# Altium footprint library Connector_PinHeader_2.54mm.PcbLib: 278 footprints (part 18 of 18)
Each footprint in its own frame and in the unit in brackets; x right, y up, seen from the top. Pads: shape width x height; smd on the part's side, far side on the other; paste and mask are expansions set on the pad; w line width, h text height; cw(c..) or ccw(c..) is an arc to the next point about the centre after c.
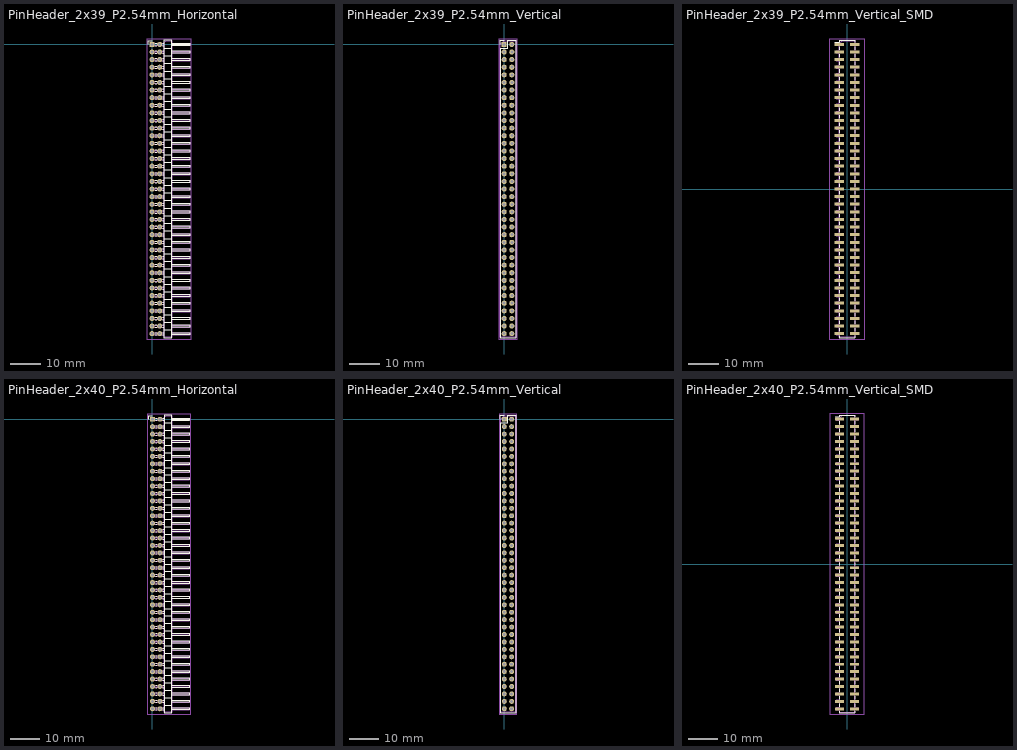
[diagram p17: the footprints below, top view; thin cyan lines are the x and y axes]

## PinHeader_2x39_P2.54mm_Horizontal [mm]
pads (78):
  rect 1.7x1.7 hole 1: 1(0,0)
  rrect100% 1.7x1.7 hole 1: 2(2.54,0) 3(0,-2.54) 4(2.54,-2.54) 5(0,-5.08) 6(2.54,-5.08) 7(0,-7.62) 8(2.54,-7.62) 9(0,-10.16) 10(2.54,-10.16) 11(0,-12.7) 12(2.54,-12.7) 13(0,-15.24) 14(2.54,-15.24) 15(0,-17.78) 16(2.54,-17.78) 17(0,-20.32) 18(2.54,-20.32) 19(0,-22.86) 20(2.54,-22.86) 21(0,-25.4) 22(2.54,-25.4) 23(0,-27.94) 24(2.54,-27.94) 25(0,-30.48) 26(2.54,-30.48) 27(0,-33.02) 28(2.54,-33.02) 29(0,-35.56) 30(2.54,-35.56) 31(0,-38.1) 32(2.54,-38.1) 33(0,-40.64) 34(2.54,-40.64) 35(0,-43.18) 36(2.54,-43.18) 37(0,-45.72) 38(2.54,-45.72) 39(0,-48.26) 40(2.54,-48.26) 41(0,-50.8) 42(2.54,-50.8) 43(0,-53.34) 44(2.54,-53.34) 45(0,-55.88) 46(2.54,-55.88) 47(0,-58.42) 48(2.54,-58.42) 49(0,-60.96) 50(2.54,-60.96) 51(0,-63.5) 52(2.54,-63.5) 53(0,-66.04) 54(2.54,-66.04) 55(0,-68.58) 56(2.54,-68.58) 57(0,-71.12) 58(2.54,-71.12) 59(0,-73.66) 60(2.54,-73.66) 61(0,-76.2) 62(2.54,-76.2) 63(0,-78.74) 64(2.54,-78.74) 65(0,-81.28) 66(2.54,-81.28) 67(0,-83.82) 68(2.54,-83.82) 69(0,-86.36) 70(2.54,-86.36) 71(0,-88.9) 72(2.54,-88.9) 73(0,-91.44) 74(2.54,-91.44) 75(0,-93.98) 76(2.54,-93.98) 77(0,-96.52) 78(2.54,-96.52)
F.SilkS:
  drawing of 323 lines, arcs and shapes, not listed
F.CrtYd:
  lines w0.254: -1.8,-98.3 -1.8,1.8 13.1,1.8 13.1,-98.3 -1.8,-98.3
F.Fab:
  drawing of 239 lines, arcs and shapes, not listed
  text "'.Designator'" at 6.15,-52.307 h1

## PinHeader_2x39_P2.54mm_Vertical [mm]
pads (78):
  rect 1.7x1.7 hole 1: 1(0,0)
  rrect100% 1.7x1.7 hole 1: 2(2.54,0) 3(0,-2.54) 4(2.54,-2.54) 5(0,-5.08) 6(2.54,-5.08) 7(0,-7.62) 8(2.54,-7.62) 9(0,-10.16) 10(2.54,-10.16) 11(0,-12.7) 12(2.54,-12.7) 13(0,-15.24) 14(2.54,-15.24) 15(0,-17.78) 16(2.54,-17.78) 17(0,-20.32) 18(2.54,-20.32) 19(0,-22.86) 20(2.54,-22.86) 21(0,-25.4) 22(2.54,-25.4) 23(0,-27.94) 24(2.54,-27.94) 25(0,-30.48) 26(2.54,-30.48) 27(0,-33.02) 28(2.54,-33.02) 29(0,-35.56) 30(2.54,-35.56) 31(0,-38.1) 32(2.54,-38.1) 33(0,-40.64) 34(2.54,-40.64) 35(0,-43.18) 36(2.54,-43.18) 37(0,-45.72) 38(2.54,-45.72) 39(0,-48.26) 40(2.54,-48.26) 41(0,-50.8) 42(2.54,-50.8) 43(0,-53.34) 44(2.54,-53.34) 45(0,-55.88) 46(2.54,-55.88) 47(0,-58.42) 48(2.54,-58.42) 49(0,-60.96) 50(2.54,-60.96) 51(0,-63.5) 52(2.54,-63.5) 53(0,-66.04) 54(2.54,-66.04) 55(0,-68.58) 56(2.54,-68.58) 57(0,-71.12) 58(2.54,-71.12) 59(0,-73.66) 60(2.54,-73.66) 61(0,-76.2) 62(2.54,-76.2) 63(0,-78.74) 64(2.54,-78.74) 65(0,-81.28) 66(2.54,-81.28) 67(0,-83.82) 68(2.54,-83.82) 69(0,-86.36) 70(2.54,-86.36) 71(0,-88.9) 72(2.54,-88.9) 73(0,-91.44) 74(2.54,-91.44) 75(0,-93.98) 76(2.54,-93.98) 77(0,-96.52) 78(2.54,-96.52)
F.SilkS:
  lines w0.254: -1.33,0 -1.33,1.33 0,1.33 ; -1.33,-97.85 -1.33,-1.27 1.27,-1.27 1.27,1.33 3.87,1.33 3.87,-97.85 -1.33,-97.85
F.CrtYd:
  lines w0.254: -1.8,-98.3 -1.8,1.8 4.35,1.8 4.35,-98.3 -1.8,-98.3
F.Fab:
  lines w0.254: -1.27,-97.79 -1.27,0 0,1.27 3.81,1.27 3.81,-97.79 -1.27,-97.79
  text "'.Designator'" at 2.11,-52.307 h1

## PinHeader_2x39_P2.54mm_Vertical_SMD [mm]
pads (78):
  rect 3.15x1 smd: 1(-2.525,48.26) 2(2.525,48.26) 3(-2.525,45.72) 4(2.525,45.72) 5(-2.525,43.18) 6(2.525,43.18) 7(-2.525,40.64) 8(2.525,40.64) 9(-2.525,38.1) 10(2.525,38.1) 11(-2.525,35.56) 12(2.525,35.56) 13(-2.525,33.02) 14(2.525,33.02) 15(-2.525,30.48) 16(2.525,30.48) 17(-2.525,27.94) 18(2.525,27.94) 19(-2.525,25.4) 20(2.525,25.4) 21(-2.525,22.86) 22(2.525,22.86) 23(-2.525,20.32) 24(2.525,20.32) 25(-2.525,17.78) 26(2.525,17.78) 27(-2.525,15.24) 28(2.525,15.24) 29(-2.525,12.7) 30(2.525,12.7) 31(-2.525,10.16) 32(2.525,10.16) 33(-2.525,7.62) 34(2.525,7.62) 35(-2.525,5.08) 36(2.525,5.08) 37(-2.525,2.54) 38(2.525,2.54) 39(-2.525,0) 40(2.525,0) 41(-2.525,-2.54) 42(2.525,-2.54) 43(-2.525,-5.08) 44(2.525,-5.08) 45(-2.525,-7.62) 46(2.525,-7.62) 47(-2.525,-10.16) 48(2.525,-10.16) 49(-2.525,-12.7) 50(2.525,-12.7) 51(-2.525,-15.24) 52(2.525,-15.24) 53(-2.525,-17.78) 54(2.525,-17.78) 55(-2.525,-20.32) 56(2.525,-20.32) 57(-2.525,-22.86) 58(2.525,-22.86) 59(-2.525,-25.4) 60(2.525,-25.4) 61(-2.525,-27.94) 62(2.525,-27.94) 63(-2.525,-30.48) 64(2.525,-30.48) 65(-2.525,-33.02) 66(2.525,-33.02) 67(-2.525,-35.56) 68(2.525,-35.56) 69(-2.525,-38.1) 70(2.525,-38.1) 71(-2.525,-40.64) 72(2.525,-40.64) 73(-2.525,-43.18) 74(2.525,-43.18) 75(-2.525,-45.72) 76(2.525,-45.72) 77(-2.525,-48.26) 78(2.525,-48.26)
F.SilkS:
  lines w0.254: -4.04,49.02 -2.6,49.02 -2.6,49.59 2.6,49.59 2.6,49.02 ; -2.6,-49.02 -2.6,-49.59 2.6,-49.59 2.6,-49.02 ; -2.6,-47.5 -2.6,-46.48 ; -2.6,-44.96 -2.6,-43.94 ; -2.6,-42.42 -2.6,-41.4 ; -2.6,-39.88 -2.6,-38.86 ; -2.6,-37.34 -2.6,-36.32 ; -2.6,-34.8 -2.6,-33.78 ; -2.6,-32.26 -2.6,-31.24 ; -2.6,-29.72 -2.6,-28.7 ; -2.6,-27.18 -2.6,-26.16 ; -2.6,-24.64 -2.6,-23.62 ; -2.6,-22.1 -2.6,-21.08 ; -2.6,-19.56 -2.6,-18.54 ; -2.6,-17.02 -2.6,-16 ; -2.6,-14.48 -2.6,-13.46 ; -2.6,-11.94 -2.6,-10.92 ; -2.6,-9.4 -2.6,-8.38 ; -2.6,-6.86 -2.6,-5.84 ; -2.6,-4.32 -2.6,-3.3 ; -2.6,-1.78 -2.6,-0.76 ; -2.6,0.76 -2.6,1.78 ; -2.6,3.3 -2.6,4.32 ; -2.6,5.84 -2.6,6.86 ; -2.6,8.38 -2.6,9.4 ; -2.6,10.92 -2.6,11.94 ; -2.6,13.46 -2.6,14.48 ; -2.6,16 -2.6,17.02 ; -2.6,18.54 -2.6,19.56 ; -2.6,21.08 -2.6,22.1 ; -2.6,23.62 -2.6,24.64 ; -2.6,26.16 -2.6,27.18 ; -2.6,28.7 -2.6,29.72 ; -2.6,31.24 -2.6,32.26 ; -2.6,33.78 -2.6,34.8 ; -2.6,36.32 -2.6,37.34 ; -2.6,38.86 -2.6,39.88 ; -2.6,41.4 -2.6,42.42 ; -2.6,43.94 -2.6,44.96 ; -2.6,46.48 -2.6,47.5 ; 2.6,-47.5 2.6,-46.48 ; 2.6,-44.96 2.6,-43.94 ; 2.6,-42.42 2.6,-41.4 ; 2.6,-39.88 2.6,-38.86 ; 2.6,-37.34 2.6,-36.32 ; 2.6,-34.8 2.6,-33.78 ; 2.6,-32.26 2.6,-31.24 ; 2.6,-29.72 2.6,-28.7 ; 2.6,-27.18 2.6,-26.16 ; 2.6,-24.64 2.6,-23.62 ; 2.6,-22.1 2.6,-21.08 ; 2.6,-19.56 2.6,-18.54 ; 2.6,-17.02 2.6,-16 ; 2.6,-14.48 2.6,-13.46 ; 2.6,-11.94 2.6,-10.92 ; 2.6,-9.4 2.6,-8.38 ; 2.6,-6.86 2.6,-5.84 ; 2.6,-4.32 2.6,-3.3 ; 2.6,-1.78 2.6,-0.76 ; 2.6,0.76 2.6,1.78 ; 2.6,3.3 2.6,4.32 ; 2.6,5.84 2.6,6.86 ; 2.6,8.38 2.6,9.4 ; 2.6,10.92 2.6,11.94 ; 2.6,13.46 2.6,14.48 ; 2.6,16 2.6,17.02 ; 2.6,18.54 2.6,19.56 ; 2.6,21.08 2.6,22.1 ; 2.6,23.62 2.6,24.64 ; 2.6,26.16 2.6,27.18 ; 2.6,28.7 2.6,29.72 ; 2.6,31.24 2.6,32.26 ; 2.6,33.78 2.6,34.8 ; 2.6,36.32 2.6,37.34 ; 2.6,38.86 2.6,39.88 ; 2.6,41.4 2.6,42.42 ; 2.6,43.94 2.6,44.96 ; 2.6,46.48 2.6,47.5
F.CrtYd:
  lines w0.254: -5.9,-50.05 -5.9,50.05 5.9,50.05 5.9,-50.05 -5.9,-50.05
F.Fab:
  drawing of 239 lines, arcs and shapes, not listed
  text "'.Designator'" at 0.84,-4.047 h1

## PinHeader_2x40_P2.54mm_Horizontal [mm]
pads (80):
  rect 1.7x1.7 hole 1: 1(0,0)
  rrect100% 1.7x1.7 hole 1: 2(2.54,0) 3(0,-2.54) 4(2.54,-2.54) 5(0,-5.08) 6(2.54,-5.08) 7(0,-7.62) 8(2.54,-7.62) 9(0,-10.16) 10(2.54,-10.16) 11(0,-12.7) 12(2.54,-12.7) 13(0,-15.24) 14(2.54,-15.24) 15(0,-17.78) 16(2.54,-17.78) 17(0,-20.32) 18(2.54,-20.32) 19(0,-22.86) 20(2.54,-22.86) 21(0,-25.4) 22(2.54,-25.4) 23(0,-27.94) 24(2.54,-27.94) 25(0,-30.48) 26(2.54,-30.48) 27(0,-33.02) 28(2.54,-33.02) 29(0,-35.56) 30(2.54,-35.56) 31(0,-38.1) 32(2.54,-38.1) 33(0,-40.64) 34(2.54,-40.64) 35(0,-43.18) 36(2.54,-43.18) 37(0,-45.72) 38(2.54,-45.72) 39(0,-48.26) 40(2.54,-48.26) 41(0,-50.8) 42(2.54,-50.8) 43(0,-53.34) 44(2.54,-53.34) 45(0,-55.88) 46(2.54,-55.88) 47(0,-58.42) 48(2.54,-58.42) 49(0,-60.96) 50(2.54,-60.96) 51(0,-63.5) 52(2.54,-63.5) 53(0,-66.04) 54(2.54,-66.04) 55(0,-68.58) 56(2.54,-68.58) 57(0,-71.12) 58(2.54,-71.12) 59(0,-73.66) 60(2.54,-73.66) 61(0,-76.2) 62(2.54,-76.2) 63(0,-78.74) 64(2.54,-78.74) 65(0,-81.28) 66(2.54,-81.28) 67(0,-83.82) 68(2.54,-83.82) 69(0,-86.36) 70(2.54,-86.36) 71(0,-88.9) 72(2.54,-88.9) 73(0,-91.44) 74(2.54,-91.44) 75(0,-93.98) 76(2.54,-93.98) 77(0,-96.52) 78(2.54,-96.52) 79(0,-99.06) 80(2.54,-99.06)
F.SilkS:
  drawing of 331 lines, arcs and shapes, not listed
F.CrtYd:
  lines w0.254: -1.8,-100.85 -1.8,1.8 13.1,1.8 13.1,-100.85 -1.8,-100.85
F.Fab:
  drawing of 245 lines, arcs and shapes, not listed
  text "'.Designator'" at 6.15,-53.577 h1

## PinHeader_2x40_P2.54mm_Vertical [mm]
pads (80):
  rect 1.7x1.7 hole 1: 1(0,0)
  rrect100% 1.7x1.7 hole 1: 2(2.54,0) 3(0,-2.54) 4(2.54,-2.54) 5(0,-5.08) 6(2.54,-5.08) 7(0,-7.62) 8(2.54,-7.62) 9(0,-10.16) 10(2.54,-10.16) 11(0,-12.7) 12(2.54,-12.7) 13(0,-15.24) 14(2.54,-15.24) 15(0,-17.78) 16(2.54,-17.78) 17(0,-20.32) 18(2.54,-20.32) 19(0,-22.86) 20(2.54,-22.86) 21(0,-25.4) 22(2.54,-25.4) 23(0,-27.94) 24(2.54,-27.94) 25(0,-30.48) 26(2.54,-30.48) 27(0,-33.02) 28(2.54,-33.02) 29(0,-35.56) 30(2.54,-35.56) 31(0,-38.1) 32(2.54,-38.1) 33(0,-40.64) 34(2.54,-40.64) 35(0,-43.18) 36(2.54,-43.18) 37(0,-45.72) 38(2.54,-45.72) 39(0,-48.26) 40(2.54,-48.26) 41(0,-50.8) 42(2.54,-50.8) 43(0,-53.34) 44(2.54,-53.34) 45(0,-55.88) 46(2.54,-55.88) 47(0,-58.42) 48(2.54,-58.42) 49(0,-60.96) 50(2.54,-60.96) 51(0,-63.5) 52(2.54,-63.5) 53(0,-66.04) 54(2.54,-66.04) 55(0,-68.58) 56(2.54,-68.58) 57(0,-71.12) 58(2.54,-71.12) 59(0,-73.66) 60(2.54,-73.66) 61(0,-76.2) 62(2.54,-76.2) 63(0,-78.74) 64(2.54,-78.74) 65(0,-81.28) 66(2.54,-81.28) 67(0,-83.82) 68(2.54,-83.82) 69(0,-86.36) 70(2.54,-86.36) 71(0,-88.9) 72(2.54,-88.9) 73(0,-91.44) 74(2.54,-91.44) 75(0,-93.98) 76(2.54,-93.98) 77(0,-96.52) 78(2.54,-96.52) 79(0,-99.06) 80(2.54,-99.06)
F.SilkS:
  lines w0.254: -1.33,0 -1.33,1.33 0,1.33 ; -1.33,-100.39 -1.33,-1.27 1.27,-1.27 1.27,1.33 3.87,1.33 3.87,-100.39 -1.33,-100.39
F.CrtYd:
  lines w0.254: -1.8,-100.85 -1.8,1.8 4.35,1.8 4.35,-100.85 -1.8,-100.85
F.Fab:
  lines w0.254: -1.27,-100.33 -1.27,0 0,1.27 3.81,1.27 3.81,-100.33 -1.27,-100.33
  text "'.Designator'" at 2.11,-53.577 h1

## PinHeader_2x40_P2.54mm_Vertical_SMD [mm]
pads (80):
  rect 3.15x1 smd: 1(-2.525,49.53) 2(2.525,49.53) 3(-2.525,46.99) 4(2.525,46.99) 5(-2.525,44.45) 6(2.525,44.45) 7(-2.525,41.91) 8(2.525,41.91) 9(-2.525,39.37) 10(2.525,39.37) 11(-2.525,36.83) 12(2.525,36.83) 13(-2.525,34.29) 14(2.525,34.29) 15(-2.525,31.75) 16(2.525,31.75) 17(-2.525,29.21) 18(2.525,29.21) 19(-2.525,26.67) 20(2.525,26.67) 21(-2.525,24.13) 22(2.525,24.13) 23(-2.525,21.59) 24(2.525,21.59) 25(-2.525,19.05) 26(2.525,19.05) 27(-2.525,16.51) 28(2.525,16.51) 29(-2.525,13.97) 30(2.525,13.97) 31(-2.525,11.43) 32(2.525,11.43) 33(-2.525,8.89) 34(2.525,8.89) 35(-2.525,6.35) 36(2.525,6.35) 37(-2.525,3.81) 38(2.525,3.81) 39(-2.525,1.27) 40(2.525,1.27) 41(-2.525,-1.27) 42(2.525,-1.27) 43(-2.525,-3.81) 44(2.525,-3.81) 45(-2.525,-6.35) 46(2.525,-6.35) 47(-2.525,-8.89) 48(2.525,-8.89) 49(-2.525,-11.43) 50(2.525,-11.43) 51(-2.525,-13.97) 52(2.525,-13.97) 53(-2.525,-16.51) 54(2.525,-16.51) 55(-2.525,-19.05) 56(2.525,-19.05) 57(-2.525,-21.59) 58(2.525,-21.59) 59(-2.525,-24.13) 60(2.525,-24.13) 61(-2.525,-26.67) 62(2.525,-26.67) 63(-2.525,-29.21) 64(2.525,-29.21) 65(-2.525,-31.75) 66(2.525,-31.75) 67(-2.525,-34.29) 68(2.525,-34.29) 69(-2.525,-36.83) 70(2.525,-36.83) 71(-2.525,-39.37) 72(2.525,-39.37) 73(-2.525,-41.91) 74(2.525,-41.91) 75(-2.525,-44.45) 76(2.525,-44.45) 77(-2.525,-46.99) 78(2.525,-46.99) 79(-2.525,-49.53) 80(2.525,-49.53)
F.SilkS:
  lines w0.254: -4.04,50.29 -2.6,50.29 -2.6,50.86 2.6,50.86 2.6,50.29 ; -2.6,-50.29 -2.6,-50.86 2.6,-50.86 2.6,-50.29 ; -2.6,-48.77 -2.6,-47.75 ; -2.6,-46.23 -2.6,-45.21 ; -2.6,-43.69 -2.6,-42.67 ; -2.6,-41.15 -2.6,-40.13 ; -2.6,-38.61 -2.6,-37.59 ; -2.6,-36.07 -2.6,-35.05 ; -2.6,-33.53 -2.6,-32.51 ; -2.6,-30.99 -2.6,-29.97 ; -2.6,-28.45 -2.6,-27.43 ; -2.6,-25.91 -2.6,-24.89 ; -2.6,-23.37 -2.6,-22.35 ; -2.6,-20.83 -2.6,-19.81 ; -2.6,-18.29 -2.6,-17.27 ; -2.6,-15.75 -2.6,-14.73 ; -2.6,-13.21 -2.6,-12.19 ; -2.6,-10.67 -2.6,-9.65 ; -2.6,-8.13 -2.6,-7.11 ; -2.6,-5.59 -2.6,-4.57 ; -2.6,-3.05 -2.6,-2.03 ; -2.6,-0.51 -2.6,0.51 ; -2.6,2.03 -2.6,3.05 ; -2.6,4.57 -2.6,5.59 ; -2.6,7.11 -2.6,8.13 ; -2.6,9.65 -2.6,10.67 ; -2.6,12.19 -2.6,13.21 ; -2.6,14.73 -2.6,15.75 ; -2.6,17.27 -2.6,18.29 ; -2.6,19.81 -2.6,20.83 ; -2.6,22.35 -2.6,23.37 ; -2.6,24.89 -2.6,25.91 ; -2.6,27.43 -2.6,28.45 ; -2.6,29.97 -2.6,30.99 ; -2.6,32.51 -2.6,33.53 ; -2.6,35.05 -2.6,36.07 ; -2.6,37.59 -2.6,38.61 ; -2.6,40.13 -2.6,41.15 ; -2.6,42.67 -2.6,43.69 ; -2.6,45.21 -2.6,46.23 ; -2.6,47.75 -2.6,48.77 ; 2.6,-48.77 2.6,-47.75 ; 2.6,-46.23 2.6,-45.21 ; 2.6,-43.69 2.6,-42.67 ; 2.6,-41.15 2.6,-40.13 ; 2.6,-38.61 2.6,-37.59 ; 2.6,-36.07 2.6,-35.05 ; 2.6,-33.53 2.6,-32.51 ; 2.6,-30.99 2.6,-29.97 ; 2.6,-28.45 2.6,-27.43 ; 2.6,-25.91 2.6,-24.89 ; 2.6,-23.37 2.6,-22.35 ; 2.6,-20.83 2.6,-19.81 ; 2.6,-18.29 2.6,-17.27 ; 2.6,-15.75 2.6,-14.73 ; 2.6,-13.21 2.6,-12.19 ; 2.6,-10.67 2.6,-9.65 ; 2.6,-8.13 2.6,-7.11 ; 2.6,-5.59 2.6,-4.57 ; 2.6,-3.05 2.6,-2.03 ; 2.6,-0.51 2.6,0.51 ; 2.6,2.03 2.6,3.05 ; 2.6,4.57 2.6,5.59 ; 2.6,7.11 2.6,8.13 ; 2.6,9.65 2.6,10.67 ; 2.6,12.19 2.6,13.21 ; 2.6,14.73 2.6,15.75 ; 2.6,17.27 2.6,18.29 ; 2.6,19.81 2.6,20.83 ; 2.6,22.35 2.6,23.37 ; 2.6,24.89 2.6,25.91 ; 2.6,27.43 2.6,28.45 ; 2.6,29.97 2.6,30.99 ; 2.6,32.51 2.6,33.53 ; 2.6,35.05 2.6,36.07 ; 2.6,37.59 2.6,38.61 ; 2.6,40.13 2.6,41.15 ; 2.6,42.67 2.6,43.69 ; 2.6,45.21 2.6,46.23 ; 2.6,47.75 2.6,48.77
F.CrtYd:
  lines w0.254: -5.9,-51.3 -5.9,51.3 5.9,51.3 5.9,-51.3 -5.9,-51.3
F.Fab:
  drawing of 245 lines, arcs and shapes, not listed
  text "'.Designator'" at 0.84,-4.047 h1